# Altium footprint library Potentiometer.PcbLib: 55 footprints (part 2 of 4)
Each footprint in its own frame and in the unit in brackets; x right, y up, seen from the top. Pads: shape width x height; smd on the part's side, far side on the other; paste and mask are expansions set on the pad; w line width, h text height; cw(c..) or ccw(c..) is an arc to the next point about the centre after c.
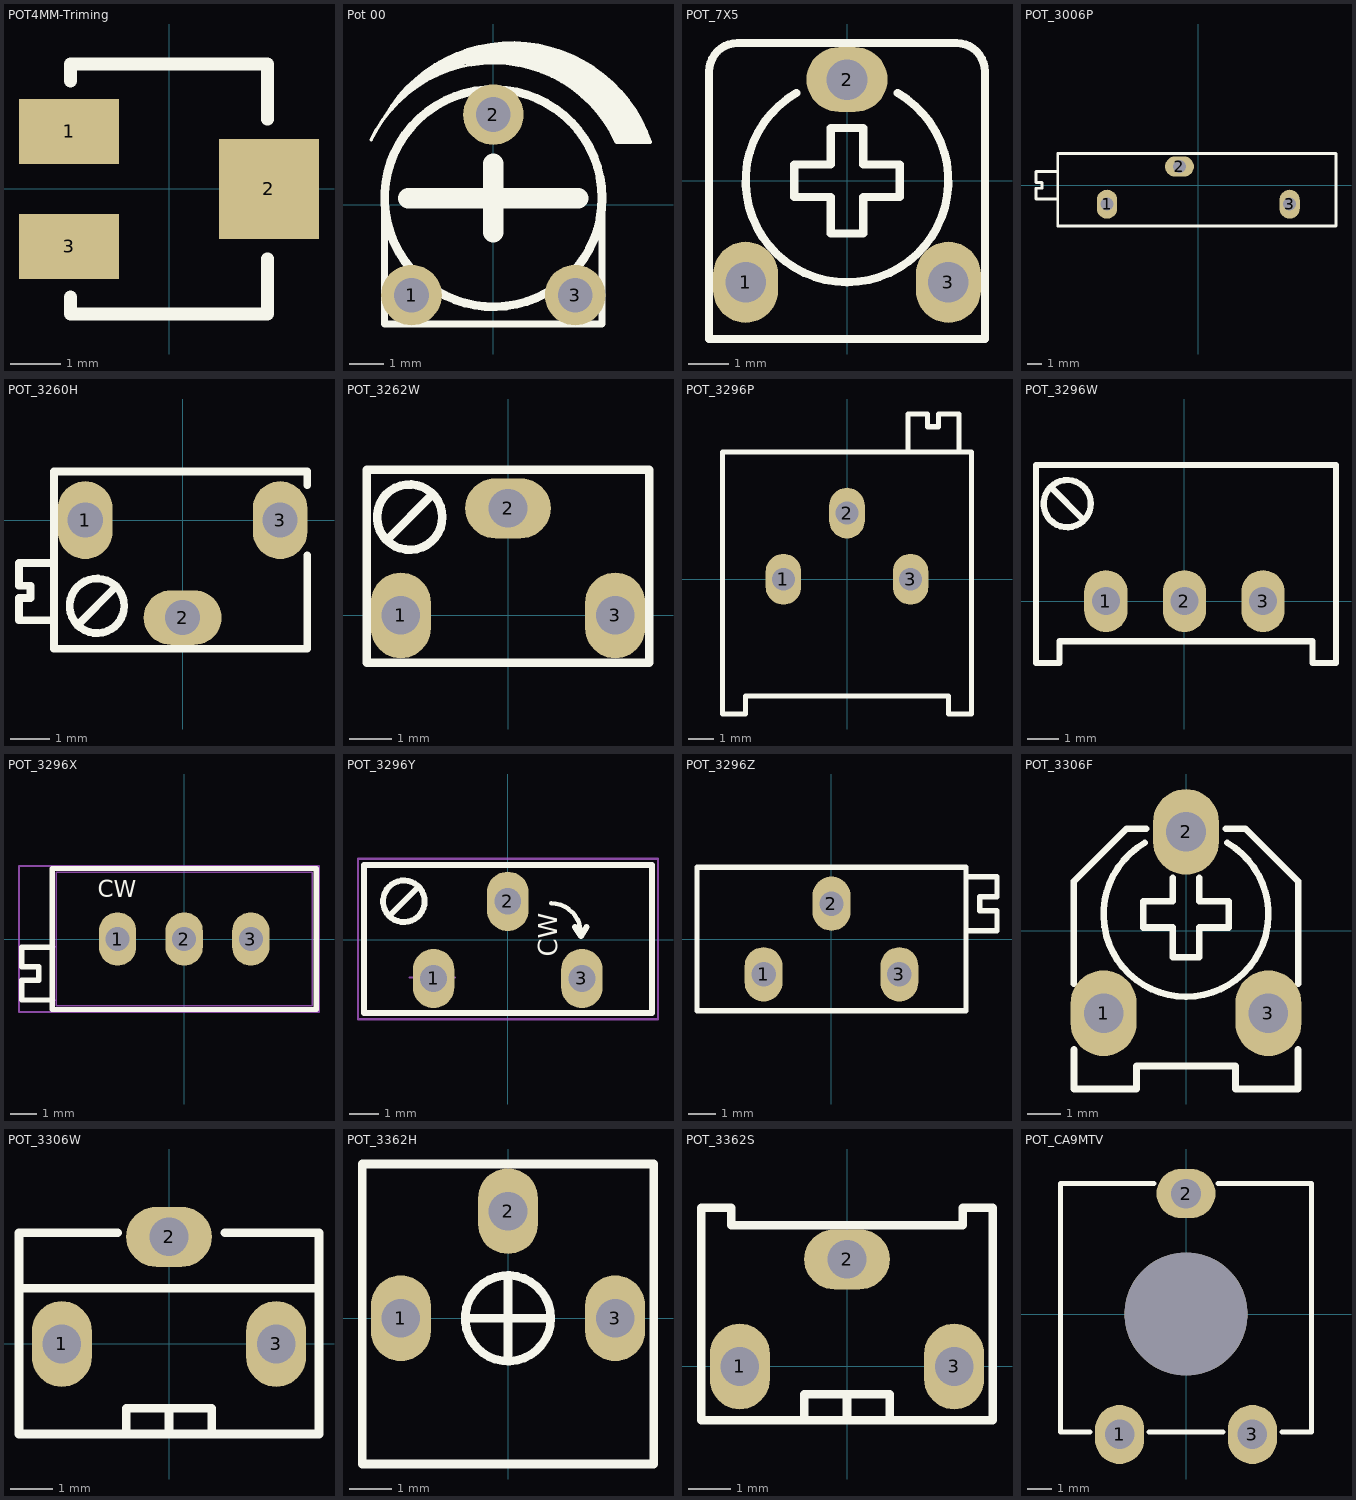
[diagram p1: the footprints below, top view; thin cyan lines are the x and y axes]

## POT4MM-Triming [mm] "Square Trimming Potentiometer"
pads (3):
  rect 2x1.3 smd: 1(-2,1.15) 3(-2,-1.15)
  rect 2x2 smd: 2(2,0)
Top Overlay:
  lines w0.254: -1.97,-2.159 -1.97,-2.5 1.97,-2.5 1.97,-1.397 ; -1.97,2.159 -1.97,2.5 1.97,2.5 1.97,1.397
3D body "SW3dPS-Pot 3214.STEP": height 5.4, standoff 0, extent -1.97,-2.4 1.97,2.4

## Pot 00 [mil]
height 185.04
pads (3):
  round 70 hole 40: 1(-94.49,-104.33) 2(0,104.33) 3(94.49,-104.33)
Top Overlay:
  circle w10: c0,7.87 r125.59
  lines w3.94: -141.04,75.24 cw(c0,7.87) 142.47,72.16 180.95,72.15 ; -124.67,102.67 cw(c21.51,18.33) 181.5,72.05 ; -108.27,123.33 -97.64,133.07 ; -100.39,133.86 -94.88,133.86 ; -97.64,136.61 -90.16,136.61 ; -94.49,140.16 -85.04,140.16 ; -90.94,143.7 -79.13,143.7 ; -85.83,147.24 -72.05,147.24 ; -82.28,150.79 -64.17,150.79 ; -77.17,154.33 -56.69,154.33 ; -73.62,157.48 -46.06,157.48 ; -67.72,161.02 -34.25,161.02 ; -62.6,164.57 104.22,164.57 ; -55.51,168.11 97.93,168.11 ; -49.21,171.26 91.23,171.65 ; -42.13,174.41 84.15,174.8 ; -33.07,177.95 75.48,177.95 ; -20.47,181.5 61.7,181.5 ; -6.69,183.86 48.71,183.86 ; 31.89,161.02 110.13,161.02 ; 45.67,157.48 115.64,157.48 ; 55.51,153.94 120.37,153.94 ; 64.96,150.39 125.09,150.39 ; 72.44,146.85 129.42,146.85 ; 84.25,139.76 136.9,139.76 ; 90.55,136.22 140.84,136.22 ; 100,129.13 146.35,129.13 ; 108.66,122.44 152.65,122.44 ; 115.35,114.96 156.19,114.96 ; 120.08,112.2 158.56,112.2 ; 121.65,109.45 160.13,109.45 ; 124.02,106.69 162.49,106.69 ; 126.38,103.54 164.85,103.54 ; 130.71,96.06 169.19,96.06 ; 133.46,92.52 171.94,92.52 ; 134.65,88.98 173.12,88.98 ; 136.61,85.43 175.09,85.43 ; 137.8,82.28 176.27,82.28 ; 139.76,78.74 178.24,78.74 ; 140.94,75.59 179.42,75.59
  lines w4.72: 78.74,143.31 134.15,143.31 ; 95.28,132.68 143.99,132.68 ; 105.51,125.98 149.5,125.98 ; 111.02,118.9 155.01,118.9
  lines w5.91: 128.35,100 166.82,100
  lines w7.87: -125.59,15.75 -125.59,-137.8 125.59,-137.8 125.59,15.75
  lines w23.62: -98.43,7.87 98.43,7.87 ; 0,-31.5 0,47.24
3D body "pot.STEP": height 183.07, standoff -62.99, extent -124.8,-144.09 127.1,145.25

## POT_7X5 [mm] "POT, TRIM, 7.5X5.0mm, pitch: 5.0mm"
pads (3):
  oval 1.6x2 hole 1: 1(-2.5,-2.5) 3(2.5,-2.5)
  oval 2x1.6 hole 1: 2(0,2.5)
Top Overlay:
  lines w0.2: -1.25,2.165 ccw(c0,0) 1.25,2.165 ; -3.4,-3.9 -3.4,2.7 cw(c-2.7,2.7) -2.7,3.4 2.7,3.4 cw(c2.7,2.7) 3.4,2.7 3.4,-3.9 -3.4,-3.9 ; -1.3,-0.4 -1.3,0.4 -0.4,0.4 -0.4,1.3 0.4,1.3 0.4,0.4 1.3,0.4 1.3,-0.4 0.4,-0.4 0.4,-1.3 -0.4,-1.3 -0.4,-0.4 -1.3,-0.4
3D body "User Library-Pot - RES_VAR1.STEP": height 7, standoff -3.9, extent -3.25,-3.775 3.25,3.275

## POT_3006P [mm] "POT, TRIM, 19.0X4.8mm 3006P"
pads (3):
  oval 1.4x2 / inner round 1.2 / far side oval 1.4x2 hole 0.9: 1(-6.3,-1.3) 3(6.3,-1.3)
  oval 2x1.4 / inner round 1.2 / far side oval 2x1.4 hole 0.9: 2(-1.3,1.3)
Top Overlay:
  lines w0.2: -9.7,-0.953 -11.2,-0.953 -11.2,-0.2 -10.795,-0.2 -10.795,0.2 -11.2,0.2 -11.2,0.953 -9.7,0.953 ; -9.7,-2.8 9.5,-2.8 9.5,2.2 -9.7,2.2 -9.7,-2.8
3D body "User Library-POT-3006P.step": height 6.35, standoff -1.91, extent -11.145,-2.715 9.425,2.115

## POT_3260H [mm] "POT, TRIM, 4.3X6.3mm 3260H"
pads (3):
  oval 1.4x2 / inner round 1.2 / far side oval 1.4x2 hole 0.9: 1(-2.5,0) 3(2.5,0)
  oval 2x1.4 / inner round 1.2 / far side oval 2x1.4 hole 0.9: 2(0,-2.5)
Top Overlay:
  circle w0.2: c-2.2,-2.2 r0.7
  lines w0.2: -3.3,-2.57 -4.2,-2.57 -4.2,-2 -3.908,-2 -3.908,-1.681 -4.2,-1.681 -4.2,-1.1 -3.3,-1.1 ; -2.7,-2.7 -1.7,-1.7 ; 3.2,-0.9 3.2,-3.3 -3.3,-3.3 -3.3,1.25 3.2,1.25 3.2,0.9
3D body "User Library-POT_3260H.step": height 6.35, standoff -4.78, extent -4.119,-3.218 3.12,1.1

## POT_3262W [mm] "POT, TRIM, 4.3X6.6mm 3262W"
pads (3):
  oval 1.4x2 / inner round 1.2 / far side oval 1.4x2 hole 0.9: 1(-2.5,0) 3(2.5,0)
  oval 2x1.4 / inner round 1.2 / far side oval 2x1.4 hole 0.9: 2(0,2.5)
Top Overlay:
  circle w0.2: c-2.294,2.294 r0.762
  lines w0.2: -2.802,1.786 -1.786,2.802 ; -3.3,-1.1 3.3,-1.1 3.3,3.4 -3.3,3.4 -3.3,-1.1
3D body "User Library-POT-3262W-1.step": height 7.37, standoff -1.91, extent -3.175,-1 3.175,3.318

## POT_3296P [mm] "POT, TRIM, 9.5X9.5mm HORIZENTAL 3296P"
pads (3):
  oval 1.4x2 / inner round 1.2 / far side oval 1.4x2 hole 0.9: 1(-2.5,0) 2(0,2.6) 3(2.5,0)
Top Overlay:
  lines w0.2: 2.4,5.03 2.4,6.5 3.163,6.5 3.163,6 3.6,6 3.6,6.5 4.4,6.5 4.4,5.03 ; -4.9,-5.3 -4,-5.3 -4,-4.6 4,-4.6 4,-5.3 4.9,-5.3 4.9,5 -4.9,5 -4.9,-5.3
3D body "User Library-Trimming Potentiometer Horizontal 3296P 503 - 50k.step": height 4.91, standoff -8.15, extent -4.765,-5.2 4.765,6.43

## POT_3296W [mm] "POT, TRIM, 10.0X5.0mm, pitch: 2.5mm 3299W 3296W S64W"
pads (3):
  oval 1.4x2 / inner round 1.2 / far side oval 1.4x2 hole 0.9: 1(-2.54,0) 2(0,0) 3(2.54,0)
Top Overlay:
  circle w0.2: c-3.791,3.151 r0.762
  lines w0.2: -4.299,3.659 -3.283,2.643 ; -4.8,-2 -4.8,4.4 4.9,4.4 4.9,-2 4.145,-2 4.145,-1.3 -4.045,-1.3 -4.045,-2 -4.8,-2
3D body "pot 3299W-1-103RLF.step": height 11.56, standoff -6.22, extent -4.725,-1.848 4.8,4.248

## POT_3296X [mm] "POT, TRIM, 10.0X5.0mm, pitch: 2.5mm, MURATA, PV36X 3296X"
height 10
pads (3):
  oval 1.4x2 / inner round 1.2 / far side oval 1.4x2 hole 0.9: 1(-2.5,0) 2(0,0) 3(2.5,0)
Top Overlay:
  lines w0.2: -4.953,-2.286 -6.096,-2.286 -6.096,-1.549 -5.461,-1.549 -5.461,-1.041 -6.096,-1.041 -6.096,-0.305 -4.953,-0.305 ; -4.953,-2.642 4.953,-2.642 4.953,2.642 -4.953,2.642 -4.953,-2.642
  text "CW" at -3.24,1.567 h0.64
Mechanical 13:
  lines w0.05: -4.8,-2.3 -6.1,-2.3 -6.1,-1.6 -5.4,-1.6 -5.4,-1 -6.1,-1 -6.1,-0.3 -4.8,-0.3 ; -4.8,-2.5 -4.8,2.5 4.8,2.5 4.8,-2.5 -4.8,-2.5
Mechanical 15:
  lines w0.076: -6.198,-2.743 -6.198,2.743 5.055,2.743 5.055,-2.743 -6.198,-2.743
3D body "Trimmer PV36 Side Adjust.STEP": height 10, standoff -2.8, extent -6.1,-2.5 4.8,2.5

## POT_3296Y [mm] "POT, TRIM, 10.0X5.0mm, pitch: 2.5mm, MURATA, PV36Y 3296Y S64Y"
height 10.7
pads (3):
  oval 1.4x2 / inner round 1.2 / far side oval 1.4x2 hole 0.9: 1(-2.5,-1.3) 2(0,1.3) 3(2.5,-1.3)
Top Overlay:
  circle w0.2: c-3.5,1.3 r0.7
  lines w0.152: 1.46,1.23 cw(c1.46,0.225) 2.465,0.225
  lines w0.2: -4,0.8 -3,1.8 ; 2.26,0.43 2.465,0.13 2.66,0.43 ; -4.84,-2.47 -4.84,2.53 4.86,2.53 4.86,-2.47 -4.84,-2.47
  text "CW" at 1.66,-0.57 h0.64
Mechanical 13:
  lines w0.076: -4.84,-2.47 -4.84,2.53 4.86,2.53 4.86,-2.47 -4.84,-2.47
Mechanical 15:
  lines w0.076: -3.302,-1.27 -1.778,-1.27 ; -2.54,-2.032 -2.54,-0.508 ; -5.046,-2.67 5.063,-2.67 5.063,2.73 -5.046,2.73 -5.046,-2.67
3D body "3100-517 TrimPot.stp": height 11.3, standoff -6, extent -4.84,-2.47 4.76,2.53

## POT_3296Z [mm] "POT, TRIM, 10.0X5.0mm, pitch: 2.5mm, 3296Z"
height 10
pads (3):
  oval 1.4x2 / inner round 1.2 / far side oval 1.4x2 hole 0.9: 1(-2.5,-1.3) 2(0,1.3) 3(2.5,-1.3)
Top Overlay:
  lines w0.2: 4.953,0.305 6.096,0.305 6.096,1.041 5.461,1.041 5.461,1.549 6.096,1.549 6.096,2.286 4.953,2.286 ; -4.953,-2.642 4.953,-2.642 4.953,2.642 -4.953,2.642 -4.953,-2.642
3D body "SW3dPS-bourns 3296Z pot.STEP": height 10.03, standoff -6.4, extent -4.765,-2.418 6.285,2.413

## POT_3306F [mm] "POT, TRIM, 7.0X7.0mm, pitch: 2.5mm, MURATA, 3306F"
pads (3):
  oval 2x2.6 hole 1.2: 1(-2.5,-2.5) 2(0,3) 3(2.5,-2.5)
Top Overlay:
  lines w0.2: -3.4,-1.6 -3.4,1.5 -1.8,3.1 -1.2,3.1 ; -1.25,2.665 ccw(c0,0.5) 1.25,2.665 ; -0.4,1.6 -0.4,0.9 -1.3,0.9 -1.3,0.1 -0.4,0.1 -0.4,-0.8 0.4,-0.8 0.4,0.1 1.3,0.1 1.3,0.9 0.4,0.9 0.4,1.6 ; 1.2,3.1 1.8,3.1 3.4,1.5 3.4,-1.6
  lines w0.203: -3.4,-3.6 -3.4,-4.8 -1.5,-4.8 -1.5,-4.1 1.5,-4.1 1.5,-4.8 3.4,-4.8 3.4,-3.6
3D body "Trimmer, 3306F.step": height 7.62, standoff -3.04, extent -3.405,-4.876 3.405,3.79

## POT_3306W [mm] "POT, TRIM, 4.5X6.8mm 3306W"
pads (3):
  oval 1.4x2 / inner round 1.2 / far side oval 1.4x2 hole 0.9: 1(-2.5,0) 3(2.5,0)
  oval 2x1.4 / inner round 1.2 / far side oval 2x1.4 hole 0.9: 2(0,2.5)
Top Overlay:
  lines w0.2: -1.2,2.6 -3.5,2.6 -3.5,1.3 ; -1,-2.1 -1,-1.5 0,-1.5 ; 0,-2.1 0,-1.5 ; 1,-2 1,-1.5 0,-1.5 ; 1.3,2.6 3.5,2.6 3.5,1.3 ; -3.5,1.3 -3.5,-2.1 3.5,-2.1 3.5,1.3 ; -3.5,1.3 3.5,1.3
3D body "User Library-POT-3306W.step": height 8.4, standoff -1.91, extent -3.405,-2 3.405,2.65

## POT_3362H [mm] "POT, TRIM, 6.6X6.8mm 3362H, 3362P, 3362R"
pads (3):
  oval 1.4x2 / inner round 1.2 / far side oval 1.4x2 hole 0.9: 1(-2.5,0) 2(0,2.5) 3(2.5,0)
Top Overlay:
  circle w0.2: c0,0 r1
  lines w0.2: -1,0 1,0 ; 0,-1 0,1 ; -3.4,-3.4 3.4,-3.4 3.4,3.6 -3.4,3.6 -3.4,-3.4
3D body "User Library-Bourns 3362R.step": height 4.7, standoff -5.47, extent -3.3,-3.3 3.3,3.754

## POT_3362S [mm] "POT, TRIM, 4.3X6.6mm 3362S"
pads (3):
  oval 1.4x2 / inner round 1.2 / far side oval 1.4x2 hole 0.9: 1(-2.5,0) 3(2.5,0)
  oval 2x1.4 / inner round 1.2 / far side oval 2x1.4 hole 0.9: 2(0,2.5)
Top Overlay:
  lines w0.2: -1,-1.25 -1,-0.65 0,-0.65 ; 0,-1.25 0,-0.65 ; 1,-1.15 1,-0.65 0,-0.65 ; -3.4,-1.25 3.4,-1.25 3.4,3.3 3.4,3.7 2.7,3.7 2.7,3.3 -2.7,3.3 -2.7,3.7 -3.4,3.7 -3.4,3.3 -3.4,-1.25
3D body "User Library-Bourns 3362S.step": height 7.1, standoff -5.4, extent -3.3,-1.1 3.3,3.6

## POT_CA9MTV [mm] "POT, TRIM, 10.0X10.0mm, CA9MTV"
pads (4):
  oval 2x2.4 hole 1.2: 1(-2.7,-4.9) 3(2.7,-4.9)
  oval 2.4x2 hole 1.2: 2(0,4.9)
  round 5 hole 5 unplated: ""(0,0)
Top Overlay:
  lines w0.2: -3.9,-4.8 -5.1,-4.8 -5.1,5.3 -1.3,5.3 ; -1.5,-4.8 1.5,-4.8 ; 1.3,5.3 5.1,5.3 5.1,-4.8 3.9,-4.8
3D body "SW3dPS-Trimpot Horizontal.STEP": height 6.4, standoff -3.4, extent -5,-5.044 5,5.156